# Altium footprint library Team Starcraft.PcbLib: 62 footprints (part 2 of 4)
Each footprint in its own frame and in the unit in brackets; x right, y up, seen from the top. Pads: shape width x height; smd on the part's side, far side on the other; paste and mask are expansions set on the pad; w line width, h text height; cw(c..) or ccw(c..) is an arc to the next point about the centre after c.
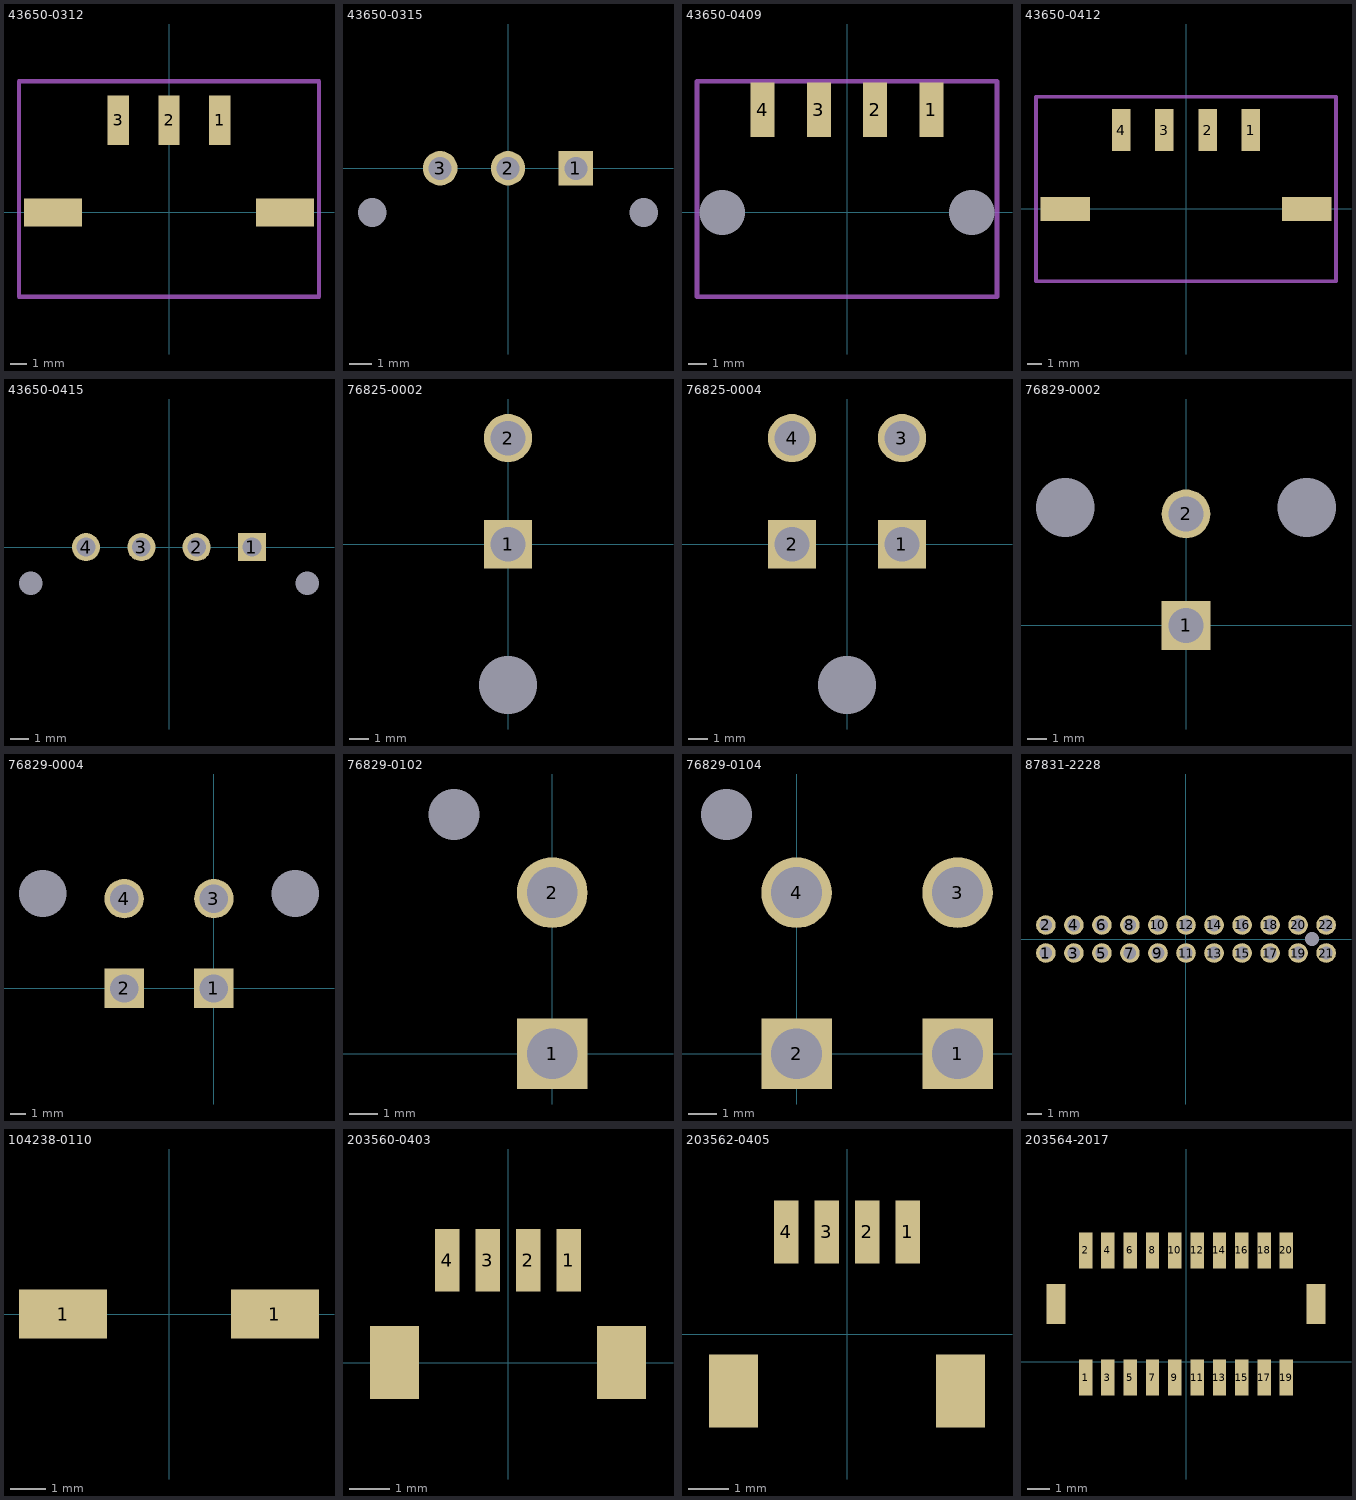
[diagram p1: the footprints below, top view; thin cyan lines are the x and y axes]

## 43650-0312 [mm] "Micro-Fit 3.0 Right Angle Header, 3.00mm Pitch, Single Row, 3 Circuits, with Solder Tab, Tin, Glow Wire Capable, Black"
height 5.57
pads (5):
  rect 1.27x2.92 smd: 1(3,5.47) 2(0,5.47) 3(-3,5.47)
  rect 3.43x1.65 smd: ""(-6.885,0) ""(6.885,0)
Mechanical 1:
  lines w0.254: -8.9,-5 -8.9,7.772 8.9,7.772 8.9,-5 -8.9,-5
3D body "436500312.stp": height 5.64, standoff -0.04, extent -8.325,-4.696 8.325,6.044

## 43650-0315 [mm] "Micro-Fit 3.0 Vertical Header, 3.00mm Pitch, Single Row, 3 Circuits"
height 9.9
pads (5):
  rect 1.524x1.524 hole 1.02: 1(3,0)
  round 1.524 hole 1.02: 2(0,0) 3(-3,0)
  round 0 hole 1.27 unplated: ""(-6,-1.96) ""(6,-1.96)
3D body "436500315.stp": height 9.95, standoff -3.13, extent -6.325,-2.47 6.325,3.135

## 43650-0409 [mm] "Micro-Fit 3.0 Right-Angle Header, 3.00mm Pitch, Single Row, 4 Circuits, with PCB Press-fit Metal Retention Clip, Tin, Glow-Wire Capable, Black"
height 5.57
pads (6):
  rect 1.27x2.92 smd: 1(4.5,5.47) 2(1.5,5.47) 3(-1.5,5.47) 4(-4.5,5.47)
  round 0 hole 2.41: ""(-6.65,0) ""(6.65,0)
Mechanical 1:
  lines w0.254: -8,-4.5 8,-4.5 8,7 -8,7 -8,-4.5
3D body "436500409.stp": height 5.64, standoff -1.97, extent -7.825,-4.596 7.825,6.144

## 43650-0412 [mm] "Micro-Fit 3.0 Right Angle Header, 3.00mm Pitch, Single Row, 4 Circuits, with Solder Tab, Tin, Glow Wire Capable, Black"
height 5.57
pads (6):
  rect 1.27x2.92 smd: 1(4.5,5.47) 2(1.5,5.47) 3(-1.5,5.47) 4(-4.5,5.47)
  rect 3.43x1.65 smd: ""(-8.385,0) ""(8.385,0)
Mechanical 1:
  lines w0.254: -10.4,-5 -10.4,7.772 10.4,7.772 10.4,-5 -10.4,-5
3D body "436500412.stp": height 5.64, standoff -0.04, extent -9.825,-4.696 9.825,6.044

## 43650-0415 [mm] "Micro-Fit 3.0 Vertical Header, 3.00mm Pitch, Single Row, 4 Circuits"
height 9.9
pads (6):
  rect 1.524x1.524 hole 1.02: 1(4.5,0)
  round 1.524 hole 1.02: 2(1.5,0) 3(-1.5,0) 4(-4.5,0)
  round 0 hole 1.27 unplated: ""(-7.5,-1.96) ""(7.5,-1.96)
3D body "436500415.stp": height 9.95, standoff -3.13, extent -7.825,-2.47 7.825,3.135

## 76825-0002 [mm] "Mega-Fit Right-Angle Header, 2 Circuits, Tin (Sn) Plating, UL 94 V-0, Tray"
height 14.53
pads (3):
  rect 2.5x2.5 hole 1.8: 1(0,0)
  round 2.5 hole 1.8: 2(0,5.5)
  round 0 hole 3 unplated: ""(0,-7.3)
3D body "768250002.stp": height 14.75, standoff -3.38, extent -4.179,-15.877 4.171,6.085

## 76825-0004 [mm] "Mega-Fit Right-Angle Header, 4 Circuits, Tin (Sn) Plating, UL 94 V-0, Tray"
height 14.53
pads (5):
  rect 2.5x2.5 hole 1.8: 1(2.85,0) 2(-2.85,0)
  round 2.5 hole 1.8: 3(2.85,5.5) 4(-2.85,5.5)
  round 0 hole 3 unplated: ""(0,-7.3)
3D body "768250004.stp": height 16.12, standoff -2.02, extent -6.004,-15.877 6.056,6.085

## 76829-0002 [mm] "Mega-Fit Vertical Header, Through Hole, 5.70mm Pitch, Dual Row, 2 Circuits, 1.52µm Tin (Sn) Plating, Glow-Wire Capable, Black"
height 14.8
pads (4):
  rect 2.5x2.5 hole 1.8: 1(0,0)
  round 2.5 hole 1.8: 2(0,5.7)
  round 0 hole 3 unplated: ""(-6.17,6.025) ""(6.17,6.025)
3D body "768290002.stp": height 15.6, standoff -2.98, extent -7.7,-3.284 7.693,10.75

## 76829-0004 [mm] "Mega-Fit Vertical Header, Through Hole, 5.70mm Pitch, Dual Row, 4 Circuits, 1.52µm Tin (Sn) Plating, Glow-Wire Capable, Black"
height 14.8
pads (6):
  rect 2.5x2.5 hole 1.8: 1(0,0) 2(-5.7,0)
  round 2.5 hole 1.8: 3(0,5.7) 4(-5.7,5.7)
  round 0 hole 3 unplated: ""(-10.87,6.025) ""(5.17,6.025)
3D body "768290004.stp": height 15.58, standoff -3, extent -12.361,-3.319 6.731,10.715

## 76829-0102 [mm] "Mega-Fit Slim Vertical Header, Through Hole, 5.70mm Pitch, Dual Row, 2 Circuits, 1.52µm Tin (Sn) Plating, Glow-Wire Capable, Black"
height 14.8
pads (3):
  rect 2.5x2.5 hole 1.8: 1(0,0)
  round 2.5 hole 1.8: 2(0,5.7)
  round 0 hole 1.8 unplated: ""(-3.48,8.47)
3D body "768290102.stp": height 15.6, standoff -2.98, extent -4.175,-3.284 4.175,10.75

## 76829-0104 [mm] "Mega-Fit Slim Vertical Header, Through Hole, 5.70mm Pitch, Dual Row, 2 Circuits, 1.52µm Tin (Sn) Plating, Glow-Wire Capable, Black"
height 14.8
pads (5):
  rect 2.5x2.5 hole 1.8: 1(5.7,0) 2(0,0)
  round 2.5 hole 1.8: 3(5.7,5.7) 4(0,5.7)
  round 0 hole 1.8 unplated: ""(-2.48,8.47)
3D body "768290104.stp": height 15.58, standoff -3, extent -3.186,-3.319 8.863,10.715

## 87831-2228 [mm]
height 6.4
pads (23):
  round 1.4 hole 0.9: 1(-10,-1) 2(-10,1) 3(-8,-1) 4(-8,1) 5(-6,-1) 6(-6,1) 7(-4,-1) 8(-4,1) 9(-2,-1) 10(-2,1) 11(0,-1) 12(0,1) 13(2,-1) 14(2,1) 15(4,-1) 16(4,1) 17(6,-1) 18(6,1) 19(8,-1) 20(8,1) 21(10,-1) 22(10,1)
  rect 0x0 hole 1 unplated: 21(9,0)
3D body "878312228.stp": height 6.45, standoff -2.45, extent -12.292,-3.159 12.358,3.141

## 104238-0110 [mm] "Mini Lite-Trap SMT Wire-to-Board Connector, Push-Button Type, 1 Circuit"
height 2.65
pads (2):
  rect 2.5x1.4 smd: 1(-3,0) 1(3,0)
3D body "1042380110.stp": height 2.75, standoff 0, extent -3.95,-1.425 3.95,1.525

## 203560-0403 [mm] "1.00mm Pitch Pico-Clasp Wire-to-Board Header, Surface Mount, Single Row, Vertical, 0.38µm Gold Plated, with Outer Positive Lock, with Pick-and-Place Tape, 4 Circuits"
height 5.4
pads (6):
  rect 0.6x1.55 smd: 1(1.5,2.525) 2(0.5,2.525) 3(-0.5,2.525) 4(-1.5,2.525)
  rect 1.2x1.8 smd: ""(-2.8,0) ""(2.8,0)
3D body "2035600403.stp": height 5.5, standoff 0, extent -3.12,-2.1 3.12,2.95

## 203562-0405 [mm] "1.00mm Pitch Pico-Clasp Wire-to-Board Header, Surface Mount, Single Row, Right-Angle, 0.38µm Gold Plated, with Outer Positive Lock, 4 Circuits"
height 4.7
pads (6):
  rect 0.6x1.55 smd: 1(1.5,2.525) 2(0.5,2.525) 3(-0.5,2.525) 4(-1.5,2.525)
  rect 1.2x1.8 smd: ""(-2.8,-1.4) ""(2.8,-1.4)
3D body "2035620405.stp": height 4.66, standoff -0.04, extent -3,-2.95 3,2.95

## 203564-2017 [mm] "1.00mm Pitch Pico-Clasp Wire-to-Board Header, Surface Mount, Dual Row, Vertical, 0.38µm Gold Plated, with Inner Positive Lock, with Pick-and-Place Tape, 20 Circuits"
height 6.8
pads (22):
  rect 0.6x1.6 smd: 1(-4.5,-0.7) 2(-4.5,5) 3(-3.5,-0.7) 4(-3.5,5) 5(-2.5,-0.7) 6(-2.5,5) 7(-1.5,-0.7) 8(-1.5,5) 9(-0.5,-0.7) 10(-0.5,5) 11(0.5,-0.7) 12(0.5,5) 13(1.5,-0.7) 14(1.5,5) 15(2.5,-0.7) 16(2.5,5) 17(3.5,-0.7) 18(3.5,5) 19(4.5,-0.7) 20(4.5,5)
  rect 0.85x1.8 smd: ""(-5.825,2.6) ""(5.825,2.6)
3D body "2035642017.stp": height 5.58, standoff 0, extent -6.15,-1.82 6.15,5.45